# Altium footprint library murrata.PcbLib: 6 footprints
Each footprint in its own frame and in the unit in brackets; x right, y up, seen from the top. Pads: shape width x height; smd on the part's side, far side on the other; paste and mask are expansions set on the pad; w line width, h text height; cw(c..) or ccw(c..) is an arc to the next point about the centre after c.
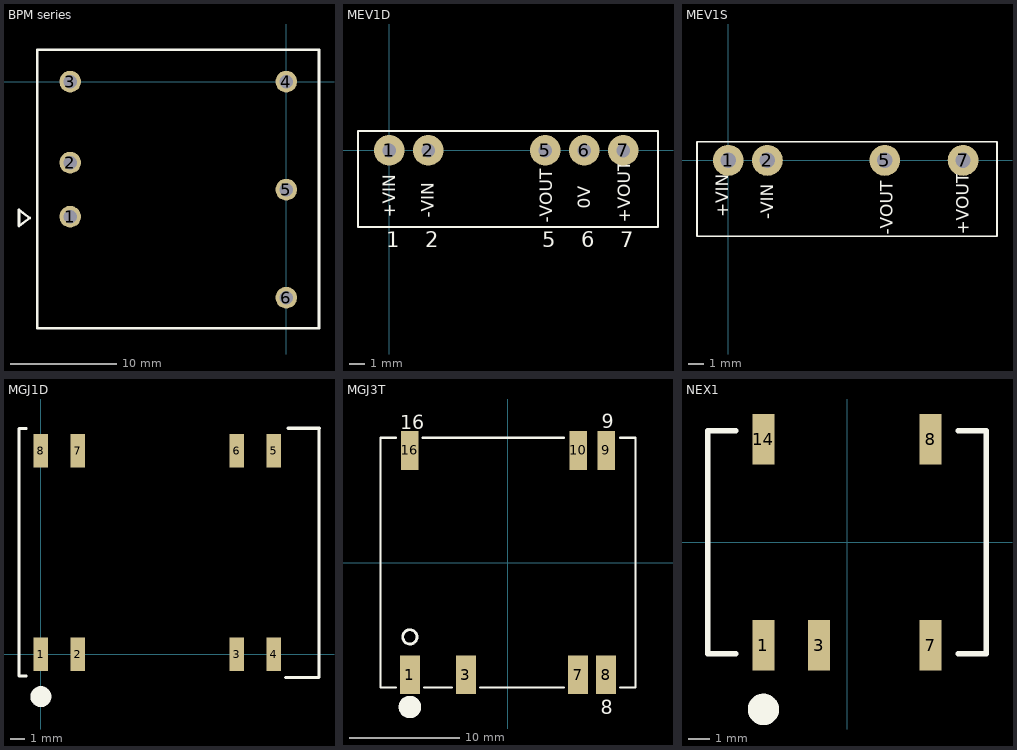
[diagram p0: the footprints below, top view; thin cyan lines are the x and y axes]

## BPM series [mil] "package 25.4*25.4"
height 400
pads (6):
  round 80 hole 50: 1(-800,-500) 2(-800,-300) 3(-800,0) 4(0,0) 5(0,-400) 6(0,-800)
Top Overlay:
  lines w10: -989.68,-534.98 -949.68,-504.98 -989.68,-474.98 -989.68,-534.98 ; -922.05,-913.39 -922.05,118.11 121.26,118.11 121.26,-913.39 -922.05,-913.39
3D body: height 400, standoff 0, extent -900,-900 100,100

## MEV1D [mm] "Dual output"
height 5.33
pads (5):
  round 2 hole 0.9: 1(0,0) 2(2.54,0) 5(10.16,0) 6(12.7,0) 7(15.24,0)
Top Overlay:
  lines w0.12: -2.032,-5 -2.032,1.27 17.5,1.27 17.5,-5 -2.032,-5
  text "+VIN" at 0.4,-4.4 h0.8
  text "-VIN" at 2.9,-4.4 h0.8
  text "-VOUT" at 10.6,-4.7 h0.8
  text "0V" at 13.1,-3.8 h0.8
  text "+VOUT" at 15.7,-4.7 h0.8
  text "7" at 15.04,-6.3 h1
  text "6" at 12.5,-6.3 h1
  text "5" at 9.96,-6.3 h1
  text "2" at 2.34,-6.3 h1
  text "1" at -0.2,-6.3 h1
3D body "mps_dcdc_mev1d_5&12&15&24vin_sc_a.step": height 10.1, standoff -4, extent -2.003,-4.877 17.497,1.143

## MEV1S [mm]
height 5.96
pads (4):
  round 2 hole 1: 1(0,0) 2(2.54,0) 5(10.16,0) 7(15.24,0)
Top Overlay:
  lines w0.1: -2.032,-4.933 17.445,-4.933 17.445,1.217 -2.032,1.217 -2.032,-4.933
  text "+VIN" at 0,-3.683 h0.8
  text "-VIN" at 2.921,-3.81 h0.8
  text "-VOUT" at 10.668,-4.826 h0.8
  text "+VOUT" at 15.621,-4.826 h0.8
3D body "mps_dcdc_mev1s_5&12&15&24vin_sc_a.step": height 10.1, standoff -4, extent -2.03,-4.77 17.47,1.25

## MGJ1D [mm] "Murata Power"
pads (8):
  rect 1x2.3 smd: 1(0,0) 2(2.54,0) 3(13.46,0) 4(16,0) 5(16,13.97) 6(13.46,13.97) 7(2.54,13.97) 8(0,13.97)
Top Overlay:
  circle w1.016: c0,-2.921 r0.208
  lines w0.2: -1,-1.5 -1.5,-1.5 -1.5,15.5 -1,15.5 ; 16.8,-1.6 19.1,-1.6 19.1,15.5
  lines w0.254: 17,15.5 19.1,15.5
3D body "mps_dcdc_mgj1d_mpc_a.step": height 4.41, standoff 0, extent -1.169,-0.393 18.77,14.593

## MGJ3T [mm]
pads (7):
  rect 1.8x3.5 smd: 1(-8.89,-10.16) 3(-3.81,-10.16) 7(6.35,-10.16) 8(8.89,-10.16)
  rect 1.58x3.5 smd: 9(8.89,10.16) 10(6.35,10.16) 16(-8.89,10.16)
Top Overlay:
  circle w0.254: c-8.89,-6.731 r0.648
  circle w1.016: c-8.89,-13.081 r0.508
  lines w0.2: -10.16,-11.303 -11.557,-11.303 -11.557,11.303 -10.16,11.303 ; -7.747,11.303 5.08,11.303 ; -7.62,-11.303 -5.08,-11.303 ; -2.54,-11.303 5.08,-11.303 ; 10.16,-11.303 11.557,-11.303 11.557,11.303 10.16,11.303
  text "8" at 8.382,-13.716 h1.27
  text "9" at 8.509,12.192 h1.27
  text "16" at -9.779,12.065 h1.27
3D body "mps_dcdc_mgj3_mc_a.step": height 13.41, standoff -0.63, extent -11.557,-11.303 11.557,11.303

## NEX1 [mm] "Murata Power-Isolated 1W Single Output SM DC-DC Converters"
height 4.36
pads (5):
  rect 1x2.3 smd: 1(-3.81,-4.7) 3(-1.27,-4.7) 7(3.81,-4.7) 8(3.81,4.7) 14(-3.81,4.7)
Top Overlay:
  circle w1.016: c-3.81,-7.621 r0.208
  lines w0.254: -5.08,-5.08 -6.35,-5.08 -6.35,5.08 -5.08,5.08 ; 5.08,-5.08 6.35,-5.08 6.35,5.08 5.08,5.08
3D body: height 1.58, standoff -2.38, extent -2.54,3.81 -2.54,3.81
3D body: height 1.58, standoff -2.38, extent 0,1.27 0,1.27
3D body: height 1.58, standoff -2.38, extent -5.08,6.35 -5.08,6.35
3D body: height 5.21, standoff -5.21, extent 16.51,3.81 16.51,3.81
3D body "mps_dcdc_nxe_a.step": height 4.48, standoff -0.01, extent -6.35,-5.207 6.35,5.207
3D body: height 5.21, standoff -5.21, extent 3.81,-11.43 3.81,-11.43
3D body: height 5.21, standoff -5.21, extent 3.81,0 3.81,0